# Altium footprint library PCBLIB.PcbLib: 775 footprints (part 16 of 49)
Each footprint in its own frame and in the unit in brackets; x right, y up, seen from the top. Pads: shape width x height; smd on the part's side, far side on the other; paste and mask are expansions set on the pad; w line width, h text height; cw(c..) or ccw(c..) is an arc to the next point about the centre after c.
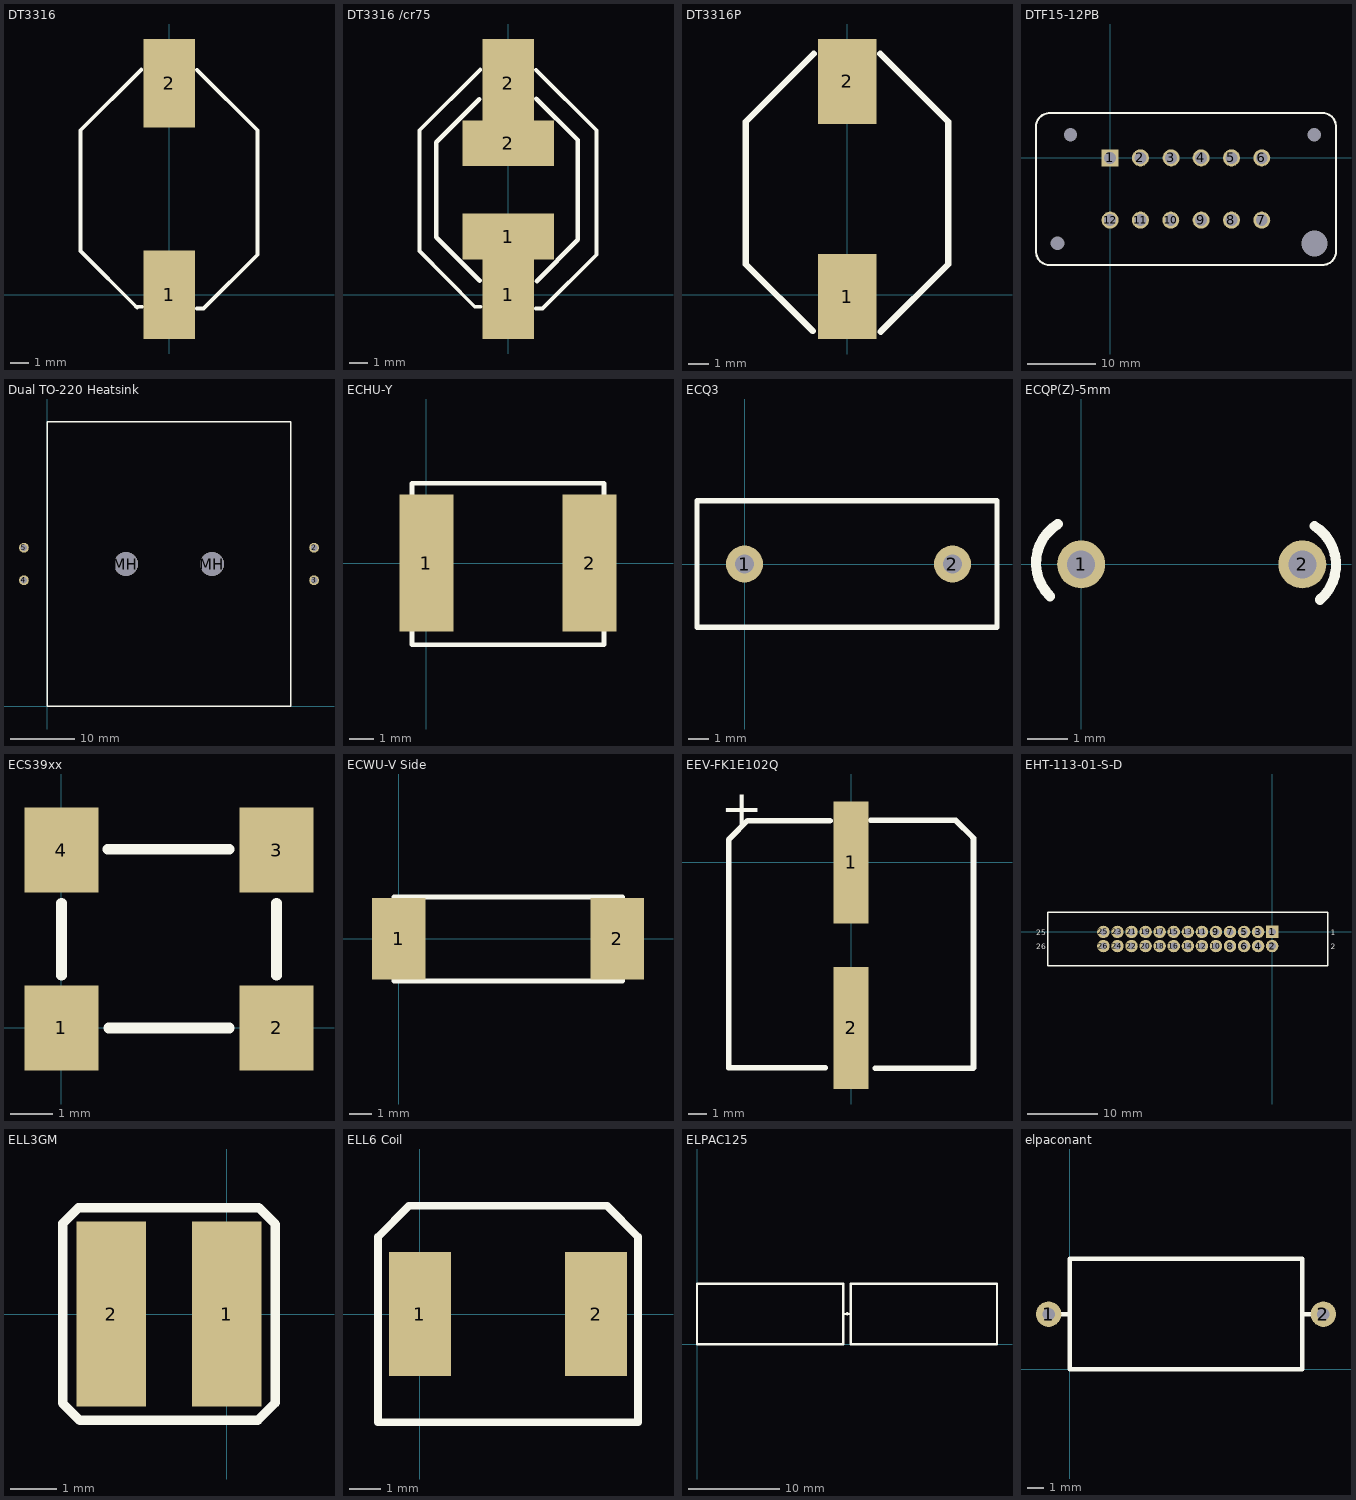
[diagram p15: the footprints below, top view; thin cyan lines are the x and y axes]

## DT3316 [mil]
pads (2):
  rect 110x191 smd: 1(0,0) 2(0,455)
TopOverlay:
  lines w8: -72,-26 -58,-26 ; -69,-28 -191,94 -191,354 -60,485 ; 60,-30 71,-30 ; 60,484 190,354 190,86 74,-30
Mechanical4:
  text ".190" at 0,25 h1

## DT3316 /cr75 [mil]
pads (4):
  rect 110x191 smd: 1(0,0) 2(0,455)
  rect 196.85x98.43 smd: 1(0,125) 2(0,325.98)
TopOverlay:
  lines w8: -60,485 -191,354 -191,94 -72,-26 -59.04,-25.95 ; 60,-30 71,-30 ; 60,484 190,354 190,86 74,-30
  lines w10: -62.41,420.95 -155,328 -155,124 -61.61,30.33 ; 60.23,422.1 150,333 150,118 61.8,29.14
Mechanical4:
  text ".190" at 0,25 h1

## DT3316P [mil]
height 190
pads (2):
  rect 110x160 smd: 1(0,-3) 2(0,402.01)
TopOverlay:
  lines w12: -65,-68 -191,58 -191,66 -191,326 -63,454 ; 62,454 190,326 190,58 63,-69 ; 190,61 190,77

## DTF15-12PB [mil]
height 1000
pads (16):
  round 10 hole 80 unplated: 0(-302.5,-492.5)
  round 10 hole 76 unplated: 0(-227.5,133.5)
  round 10 hole 150 unplated: 0(1177.5,-492.5)
  round 10 hole 78 unplated: 0(1177.5,133.5)
  rect 98x98 hole 68: 1(0,0)
  round 98 hole 68: 2(175,0) 3(352,0) 4(525,0) 5(700,0) 6(875,0) 7(875,-359) 8(700,-359) 9(525,-359) 10(350,-359) 11(175,-359) 12(0,-359)
TopOverlay:
  lines w12: -427,-547 -427,173 cw(c-349,180.04) -356,258.04 ; -427,-546.5 ccw(c-349,-539.5) -341.96,-617.5 1232,-617.5 ; -356,258.5 1217,258.5 ; 1217.46,258.5 cw(c1224.5,180.5) 1302.5,187.5 1302.5,-532.46 cw(c1224.5,-539.5) 1231.5,-617.5
Mechanical4:
  text "1.188" at 0,0 h1

## Dual TO-220 Heatsink [mil]
pads (6):
  round 60 hole 40: 2(1643,975) 3(1643,775) 4(-143,775) 5(-143,975)
  round 148 hole 148: MH(485,875) MH(1015,875)
TopOverlay:
  lines w10: 0,0 1500,0 1500,1750 0,1750 0,0

## ECHU-Y [mil]
pads (2):
  rect 89x224.5 smd: 1(0,0) 2(268,0)
TopOverlay:
  lines w8: -23.57,-134.05 291.48,-134.05 291.48,131.08 -23.57,131.08 -23.57,-134.05

## ECQ3 [mil]
pads (2):
  round 70 hole 36: 1(0,0) 2(394,0)
TopOverlay:
  lines w10: -90,-120 -90,120 478.35,120 478.35,-120 -90,-120
Mechanical4:
  text ".524" at 0,0 h1

## ECQP(Z)-5mm [mm]
height 12.5
pads (2):
  round 1.2 hole 0.7: 1(0,0) 2(5.543,0)
TopOverlay:
  lines w0.254: -0.778,-0.8 cw(c0.018,0.029) -0.586,1.008 ; 5.846,0.963 cw(c5.236,-0.012) 5.982,-0.887

## ECS39xx [mm]
height 1.75
pads (4):
  rect 1.75x2 smd: 1(0,0) 2(5.08,0) 3(5.08,4.2) 4(0,4.2)
TopOverlay:
  lines w0.254: 0,1.245 0,2.946 ; 1.092,4.216 3.962,4.216 ; 1.118,0 3.962,0 ; 5.08,1.245 5.08,2.946
  text "." at -1.829,-0.051 h0.89

## ECWU-V Side [mil]
pads (2):
  rect 92.5x140 smd: 1(0,0) 2(375.79,0)
TopOverlay:
  lines w8: -8.64,-72.79 -8.64,71.46 385.06,71.46 385.06,-72.79 -8.64,-72.79

## EEV-FK1E102Q [mil]
height 255.91
pads (2):
  rect 75x265 smd: 1(0,0) 2(0,-359.23)
TopOverlay:
  lines w12: -203,-445.6 -56,-445.6 -265.6,-445.6 -265.75,-445.45 -265.75,-395.2 -265.75,40.8 -265.75,49.2 -261.55,53.4 -224.55,90.4 -45.6,90.4 ; 43.2,91.2 227.2,91.2 263.35,55.05 265.75,52.65 265.75,33.6 ; 200.8,-446.4 52.8,-446.4 264.8,-446.4 265.75,-445.45 265.75,25 ; 265.75,10.4 265.75,42.25
  text "+" at -283.2,79.2 h80

## EHT-113-01-S-D [mil]
height 50
pads (26):
  rect 70x70 hole 40: 1(0,0)
  round 70 hole 40: 2(0,-79) 3(-79,0) 4(-79,-79) 5(-158,0) 6(-158,-79) 7(-237,0) 8(-237,-79) 9(-316,0) 10(-316,-79) 11(-395,0) 12(-395,-79) 13(-474,0) 14(-474,-79) 15(-553,0) 16(-553,-79) 17(-632,0) 18(-632,-79) 19(-711,0) 20(-711,-79) 21(-790,0) 22(-790,-79) 23(-869,0) 24(-869,-79) 25(-948,0) 26(-948,-79)
TopOverlay:
  lines w8: -1259.5,-189.5 311.5,-189.5 311.5,110.5 -1259.5,110.5 -1259.5,-189.5
  text "1" at 328.14,-17.65 h30
  text "2" at 328.14,-95.98 h30
  text "25" at -1326.34,-17.65 h30
  text "26" at -1324.43,-95.98 h30

## ELL3GM [mm]
pads (2):
  rect 1.5x4 smd: 1(0,0) 2(-2.5,0)
TopOverlay:
  lines w0.203: -3.55,-1.936 -3.55,-1.651 -3.55,0 -3.55,1.962 -3.212,2.3 -2.3,2.3 0.2,2.3 0.697,2.3 1.05,1.947 1.05,0.457 1.05,-1.499 1.05,-1.922 0.672,-2.3 -0.33,-2.3 -2.362,-2.3 -3.186,-2.3 -3.55,-1.936

## ELL6 Coil [mm]
height 5
pads (2):
  rect 2x4 smd: 1(0,0) 2(5.7,0)
TopOverlay:
  lines w0.254: -1.35,-3.5 7.05,-3.5 7.05,2.5 6.05,3.5 5.35,3.5 0.35,3.5 -0.35,3.5 -1.35,2.5 -1.35,-3.5

## ELPAC125 [mil]
TopOverlay:
  lines w8: 631,130 662,130
  lines w10: 0,0 630,0 630,260 0,260 0,0 ; 661,-1 1291,-1 1291,260 661,260 661,-1
  lines w15: 646,130 647,130

## elpaconant [mil]
pads (2):
  round 60 hole 30 unplated: 1(-50,130) 2(600,130)
TopOverlay:
  lines w10: -20,130 0,130 ; 550,130 570,130 ; 0,0 550,0 550,261 0,261 0,0